# Altium footprint library cool_library.PcbLib: 1182 footprints (part 28 of 75)
Each footprint in its own frame and in the unit in brackets; x right, y up, seen from the top. Pads: shape width x height; smd on the part's side, far side on the other; paste and mask are expansions set on the pad; w line width, h text height; cw(c..) or ccw(c..) is an arc to the next point about the centre after c.
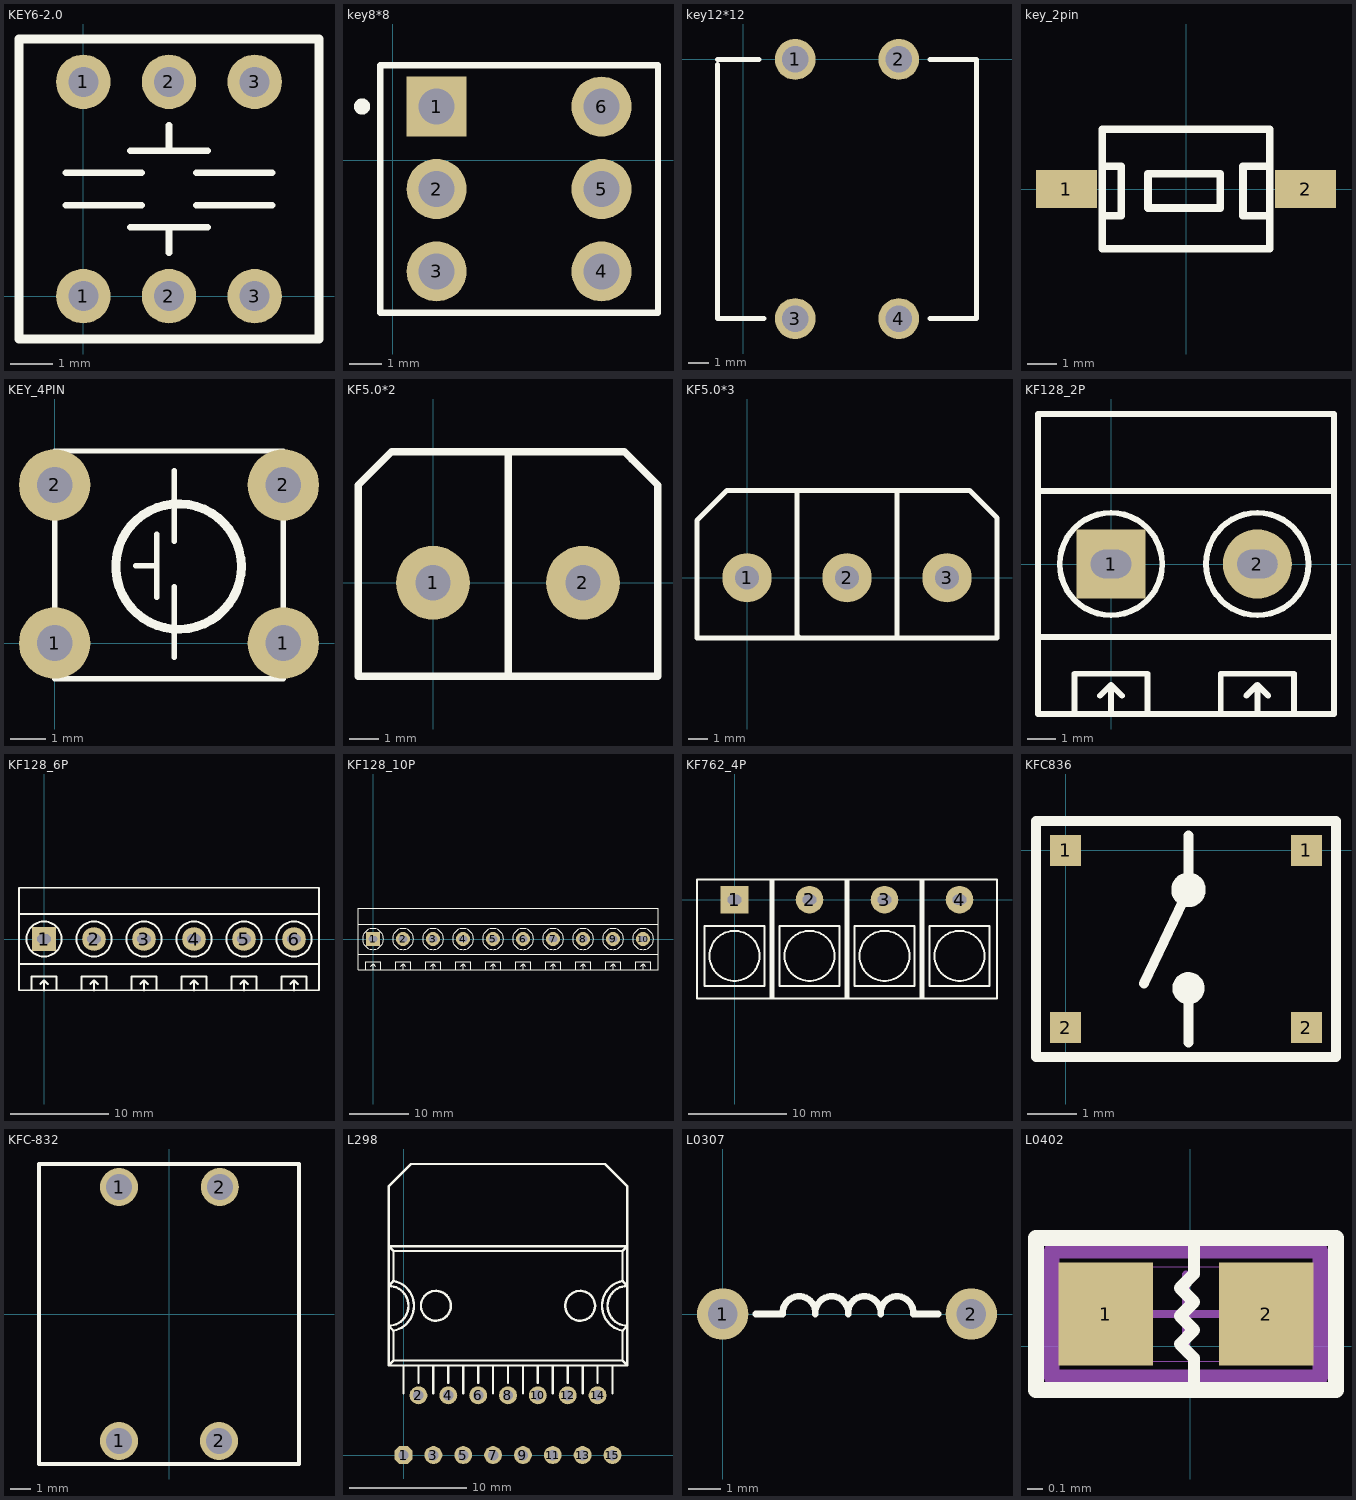
[diagram p27: the footprints below, top view; thin cyan lines are the x and y axes]

## KEY6-2.0 [mm] "方形,7x7mm,6pin/2.0mm间距"
pads (6):
  round 1.27 hole 0.7: 1(0,0) 1(0,5) 2(2,0) 2(2,5) 3(4,0) 3(4,5)
Top Overlay:
  lines w0.152: -0.413,2.119 1.365,2.119 ; -0.413,2.881 1.365,2.881 ; 1.1,1.611 2.9,1.611 ; 1.1,3.389 2.9,3.389 ; 2,1.011 2,1.611 ; 2,3.389 2,3.989 ; 2.635,2.119 4.413,2.119 ; 2.635,2.881 4.413,2.881
  lines w0.203: -1.5,-1 -1.5,6 5.5,6 5.5,-1 -1.5,-1

## key8*8 [mm]
pads (6):
  rect 1.85x1.85 hole 1.1: 1(1.346,1.651)
  round 1.85 hole 1.1: 2(1.346,-0.889) 3(1.346,-3.429) 4(6.426,-3.429) 5(6.426,-0.889) 6(6.426,1.651)
Top Overlay:
  circle w0.25: c-0.95,1.652 r0.125
  lines w0.2: -0.394,-4.699 8.166,-4.699 8.166,2.921 -0.394,2.921 -0.394,-4.699

## key12*12 [mm]
pads (4):
  round 2 hole 1.3: 1(2.54,0) 2(7.62,0) 3(2.54,-12.7) 4(7.62,-12.7)
Top Overlay:
  lines w0.254: -1.27,-0.254 -1.27,-12.7 1.016,-12.7 ; -1.27,0 0.762,0 ; 9.144,-12.7 11.43,-12.7 11.43,0 9.144,0

## key_2pin [mm]
pads (2):
  rect 2.032x1.27 smd: 1(-4,0) 2(4,0)
Top Overlay:
  lines w0.254: -2.8,-0.889 -2.159,-0.889 -2.159,0.762 -2.8,0.762 ; 2.8,-0.889 1.905,-0.889 1.905,0.762 2.8,0.762 ; -2.8,-2 2.8,-2 2.8,2 -2.8,2 -2.8,-2 ; -1.27,-0.635 -1.27,0.508 1.143,0.508 1.143,-0.635 -1.27,-0.635

## KEY_4PIN [mil]
pads (4):
  round 80 hole 40: 1(0,0) 1(256,0) 2(0,177) 2(256,177)
Top Overlay:
  circle w10: c138.74,85.67 r70.27
  lines w6: 90.55,86.61 114.17,86.61 ; 114.17,51.18 114.17,122.05 ; 133.86,-15.75 133.86,62.99 ; 133.86,114.17 133.86,192.91 ; 0,-40 0,215 256,215 256,-40 0,-40

## KF5.0*2 [mm]
pads (2):
  round 2.5 hole 1.2: 1(0,0) 2(5.08,0)
Top Overlay:
  lines w0.254: 2.54,-3.175 2.54,4.445 ; 6.731,4.191 7.62,3.302 ; 7.62,3.302 7.62,2.54 7.62,-3.175 -2.54,-3.175 -2.54,2.54 -2.54,3.302 -1.397,4.445 6.477,4.445 7.62,3.302

## KF5.0*3 [mm]
pads (3):
  round 2.5 hole 1.2: 1(0,0) 2(5.08,0) 3(10.16,0)
Top Overlay:
  lines w0.254: 2.54,4.445 2.54,-2.921 2.667,-3.048 ; 7.62,-3.048 7.62,4.445 ; -2.54,-3.048 -2.54,2.54 -2.54,2.921 -1.016,4.445 11.303,4.445 12.7,3.048 12.7,2.54 12.7,-3.048 -2.54,-3.048

## KF128_2P [mm]
height 8.23
pads (2):
  rect 2.4x2.4 hole 1 slot 1.4 at 0 deg: 1(0,0)
  round 2.4 hole 1 slot 1.4 at 0 deg: 2(5.08,0)
Top Overlay:
  circle w0.203: c5.08,0 r1.778
  circle w0.203: c0,0 r1.778
  lines w0.203: -2.54,-2.54 7.747,-2.54 ; -2.54,2.54 7.747,2.54 ; -1.27,-5.207 -1.27,-3.81 1.27,-3.81 1.27,-5.207 ; -0.381,-4.572 0,-4.191 ; 0,-5.207 0,-4.572 0,-4.191 ; 0.381,-4.572 0,-4.191 ; 3.81,-5.207 3.81,-3.81 6.35,-3.81 6.35,-5.207 ; 4.699,-4.572 5.08,-4.191 ; 5.08,-5.207 5.08,-4.191 ; 5.461,-4.572 5.08,-4.191 ; -2.54,-5.207 7.747,-5.207 7.747,5.207 -2.54,5.207 -2.54,0 -2.54,-5.207

## KF128_6P [mm]
height 8.23
pads (6):
  rect 2.4x2.4 hole 1 slot 1.4 at 0 deg: 1(0,0)
  round 2.4 hole 1 slot 1.4 at 0 deg: 2(5.08,0) 3(10.16,0) 4(15.24,0) 5(20.32,0) 6(25.4,0)
Top Overlay:
  circle w0.203: c0,0 r1.778
  circle w0.203: c5.08,0 r1.778
  circle w0.203: c10.16,0 r1.778
  circle w0.203: c15.24,0 r1.778
  circle w0.203: c20.32,0 r1.778
  circle w0.203: c25.4,0 r1.778
  lines w0.203: -2.54,-2.54 27.94,-2.54 ; -2.54,2.54 27.94,2.54 ; -1.27,-5.207 -1.27,-3.81 1.27,-3.81 1.27,-5.207 ; -0.381,-4.572 0,-4.191 ; 0,-5.207 0,-4.191 ; 0.381,-4.572 0,-4.191 ; 3.81,-5.207 3.81,-3.81 6.35,-3.81 6.35,-5.207 ; 4.699,-4.572 5.08,-4.191 ; 5.08,-5.207 5.08,-4.191 ; 5.461,-4.572 5.08,-4.191 ; 8.89,-5.207 8.89,-3.81 11.43,-3.81 11.43,-5.207 ; 9.779,-4.572 10.16,-4.191 ; 10.16,-5.207 10.16,-4.191 ; 10.541,-4.572 10.16,-4.191 ; 13.97,-5.207 13.97,-3.81 16.51,-3.81 16.51,-5.207 ; 14.859,-4.572 15.24,-4.191 ; 15.24,-5.207 15.24,-4.191 ; 15.621,-4.572 15.24,-4.191 ; 19.05,-5.207 19.05,-3.81 21.59,-3.81 21.59,-5.207 ; 19.939,-4.572 20.32,-4.191 ; 20.32,-5.207 20.32,-4.191 ; 20.701,-4.572 20.32,-4.191 ; 24.13,-5.207 24.13,-3.81 26.67,-3.81 26.67,-5.207 ; 25.019,-4.572 25.4,-4.191 ; 25.4,-5.207 25.4,-4.191 ; 25.781,-4.572 25.4,-4.191 ; -2.54,-5.207 -2.54,0 -2.54,5.207 27.94,5.207 27.94,-5.207 -2.54,-5.207

## KF128_10P [mm]
height 8.23
pads (10):
  rect 2.4x2.4 hole 1 slot 1.4 at 0 deg: 1(0,0)
  round 2.4 hole 1 slot 1.4 at 0 deg: 2(5.08,0) 3(10.16,0) 4(15.24,0) 5(20.32,0) 6(25.4,0) 7(30.48,0) 8(35.56,0) 9(40.64,0) 10(45.72,0)
Top Overlay:
  circle w0.203: c45.72,0 r1.778
  circle w0.203: c40.64,0 r1.778
  circle w0.203: c25.4,0 r1.778
  circle w0.203: c20.32,0 r1.778
  circle w0.203: c15.24,0 r1.778
  circle w0.203: c10.16,0 r1.778
  circle w0.203: c5.08,0 r1.778
  circle w0.203: c0,0 r1.778
  circle w0.203: c30.48,0 r1.778
  circle w0.203: c35.56,0 r1.778
  lines w0.203: -2.54,-2.54 48.26,-2.54 ; -2.54,2.54 48.26,2.54 ; -1.27,-5.207 -1.27,-3.81 1.27,-3.81 1.27,-5.207 ; -0.381,-4.572 0,-4.191 ; 0,-5.207 0,-4.191 ; 0.381,-4.572 0,-4.191 ; 3.81,-5.207 3.81,-3.81 6.35,-3.81 6.35,-5.207 ; 4.699,-4.572 5.08,-4.191 ; 5.08,-5.207 5.08,-4.191 ; 5.461,-4.572 5.08,-4.191 ; 8.89,-5.207 8.89,-3.81 11.43,-3.81 11.43,-5.207 ; 9.779,-4.572 10.16,-4.191 ; 10.16,-5.207 10.16,-4.191 ; 10.541,-4.572 10.16,-4.191 ; 13.97,-5.207 13.97,-3.81 16.51,-3.81 16.51,-5.207 ; 14.859,-4.572 15.24,-4.191 ; 15.24,-5.207 15.24,-4.191 ; 15.621,-4.572 15.24,-4.191 ; 19.05,-5.207 19.05,-3.81 21.59,-3.81 21.59,-5.207 ; 19.939,-4.572 20.32,-4.191 ; 20.32,-5.207 20.32,-4.191 ; 20.701,-4.572 20.32,-4.191 ; 24.13,-5.207 24.13,-3.81 26.67,-3.81 26.67,-5.207 ; 25.019,-4.572 25.4,-4.191 ; 25.4,-5.207 25.4,-4.191 ; 25.781,-4.572 25.4,-4.191 ; 29.21,-5.207 29.21,-3.81 31.75,-3.81 31.75,-5.207 ; 30.099,-4.572 30.48,-4.191 ; 30.48,-5.207 30.48,-4.191 ; 30.861,-4.572 30.48,-4.191 ; 34.29,-5.207 34.29,-3.81 36.83,-3.81 36.83,-5.207 ; 35.179,-4.572 35.56,-4.191 ; 35.56,-5.207 35.56,-4.191 ; 35.941,-4.572 35.56,-4.191 ; 39.37,-5.207 39.37,-3.81 41.91,-3.81 41.91,-5.207 ; 40.259,-4.572 40.64,-4.191 ; 40.64,-5.207 40.64,-4.191 ; 41.021,-4.572 40.64,-4.191 ; 44.45,-5.207 44.45,-3.81 46.99,-3.81 46.99,-5.207 ; 45.339,-4.572 45.72,-4.191 ; 45.72,-5.207 45.72,-4.191 ; 46.101,-4.572 45.72,-4.191 ; -2.54,-5.207 48.26,-5.207 48.26,5.207 -2.54,5.207 -2.54,0 -2.54,-5.207

## KF762_4P [mm]
height 8.23
pads (4):
  rect 2.8x2.8 hole 1 slot 1.4 at 0 deg: 1(0,0)
  round 2.8 hole 1 slot 1.4 at 0 deg: 2(7.62,0) 3(15.24,0) 4(22.86,0)
Top Overlay:
  circle w0.203: c22.86,-5.715 r2.54
  circle w0.203: c15.24,-5.715 r2.54
  circle w0.203: c0,-5.715 r2.54
  circle w0.203: c7.62,-5.715 r2.54
  rectangle: 18.796,-10.033 19.304,2.032
  rectangle: 11.176,-10.033 11.684,2.032
  rectangle: 3.556,-10.033 4.064,2.032
  lines w0.203: -3.81,-10.033 -3.81,2.032 26.67,2.032 26.67,-10.033 -3.81,-10.033 ; -3.048,-8.763 3.048,-8.763 3.048,-2.667 -3.048,-2.667 -3.048,-8.763 ; 4.572,-8.763 4.572,-2.667 10.668,-2.667 10.668,-8.763 4.572,-8.763 ; 12.192,-8.763 18.288,-8.763 18.288,-2.667 12.192,-2.667 12.192,-8.763 ; 19.812,-8.763 25.908,-8.763 25.908,-2.667 19.812,-2.667 19.812,-8.763

## KFC836 [mm]
pads (4):
  rect 0.635x0.635 smd: 1(0,0) 1(4.9,0) 2(0,-3.6) 2(4.9,-3.6)
Top Overlay:
  circle w0.254: c2.5,-0.8 r0.224
  circle w0.254: c2.5,-2.8 r0.2
  lines w0.203: 1.6,-2.7 2.5,-0.8 2.5,0.3 ; 2.5,-3.9 2.5,-2.8 ; -0.6,-4.2 5.5,-4.2 5.5,0.6 -0.6,0.6 -0.6,-4.2

## KFC-832 [mm] "微动开关"
pads (4):
  round 1.9 hole 1.3: 1(-2.5,-6.35) 1(-2.5,6.35) 2(2.5,-6.35) 2(2.54,6.35)
Top Overlay:
  lines w0.203: -6.5,-7.5 -6.5,7.5 6.5,7.5 6.5,-7.5 -6.5,-7.5

## L298 [mil] "L298"
height 10
pads (15):
  oct 60x60 hole 35: 1(0,0)
  round 60 hole 35: 2(50,200) 3(100,0) 4(150,200) 5(200,0) 6(250,200) 7(300,0) 8(350,200) 9(400,0) 10(450,200) 11(500,0) 12(550,200) 13(600,0) 14(650,200) 15(700,0)
Top Overlay:
  circle w8: c108.33,500 r50
  circle w8: c591.67,500 r50
  lines w7.87: -50,433.33 -33.33,416.67 -33.33,316.67 ; -50,566.67 -33.33,583.33 -33.33,683.33 ; 0,207.48 0,300 ; 50,241.67 50,300 ; 100,207.48 100,300 ; 150,241.67 150,300 ; 200,207.48 200,300 ; 250,241.67 250,300 ; 300,207.48 300,300 ; 350,241.67 350,300 ; 400,207.48 400,300 ; 450,241.67 450,300 ; 500,207.48 500,300 ; 550,241.67 550,300 ; 600,207.48 600,300 ; 650,241.67 650,300 ; 700,207.48 700,300 ; 750,433.33 733.33,416.67 733.33,316.67 ; 750,566.67 733.33,583.33 733.33,683.33 ; -50,300 -50,700 ; -50,300 750,300 ; -50,300 -33.33,316.67 ; -50,700 -50,900 25,975 675,975 750,900 750,700 ; -50,700 750,700 ; -50,700 -33.33,683.33 ; -33.33,316.67 733.33,316.67 ; -33.33,683.33 733.33,683.33 ; 733.33,316.67 750,300 ; 733.33,683.33 750,700 ; 750,300 750,700
  lines w8: -50,433.33 ccw(c-50,500) -50,566.67 ; -33.78,416.56 ccw(c-50,500) -33.78,583.44 ; 733.78,416.56 cw(c750,500) 733.78,583.44 ; 750,433.33 cw(c750,500) 750,566.67

## L0307 [mil]
pads (2):
  round 62 hole 36: 1(0,0) 2(300,0)
Top Overlay:
  lines w7.87: 40,0 72.52,0 cw(c92.2,1.57) 111.89,0 cw(c131.57,1.57) 151.26,0 cw(c170.94,1.57) 190.63,0 cw(c210.31,1.57) 230,0 260,0

## L0402 [mm]
pads (2):
  rect 0.6x0.65 smd: 1(-0.533,0.203) 2(0.483,0.203)
Top Overlay:
  lines w0.076: 0.025,-0.254 0.025,-0.076 -0.064,0.013 0.025,0.102 -0.064,0.191 0.025,0.279 -0.064,0.368 0.025,0.457 0.025,0.66
  lines w0.102: -0.975,-0.279 -0.975,0.686 0.925,0.686 0.925,-0.279 -0.975,-0.279
Mechanical 15:
  lines w0.1: -0.875,-0.197 0.825,-0.197 0.825,0.603 -0.875,0.603 -0.875,-0.197
  text "1" at -0.108,-0.022 h0.38
Mechanical 16:
  lines w0.001: -0.575,-0.097 0.525,-0.097 0.525,0.503 -0.575,0.503 -0.575,-0.097
  lines w0.05: -0.275,0.203 0.225,0.203 ; -0.025,-0.047 -0.025,0.453 ; -0.975,-0.297 0.925,-0.297 0.925,0.703 -0.975,0.703 -0.975,-0.297
3D body: height 0.35, standoff 0, extent -0.5,-0.051 0.5,0.449